# Altium footprint library 开关_按键封装库.PcbLib: 175 footprints (part 4 of 11)
Each footprint in its own frame and in the unit in brackets; x right, y up, seen from the top. Pads: shape width x height; smd on the part's side, far side on the other; paste and mask are expansions set on the pad; w line width, h text height; cw(c..) or ccw(c..) is an arc to the next point about the centre after c.
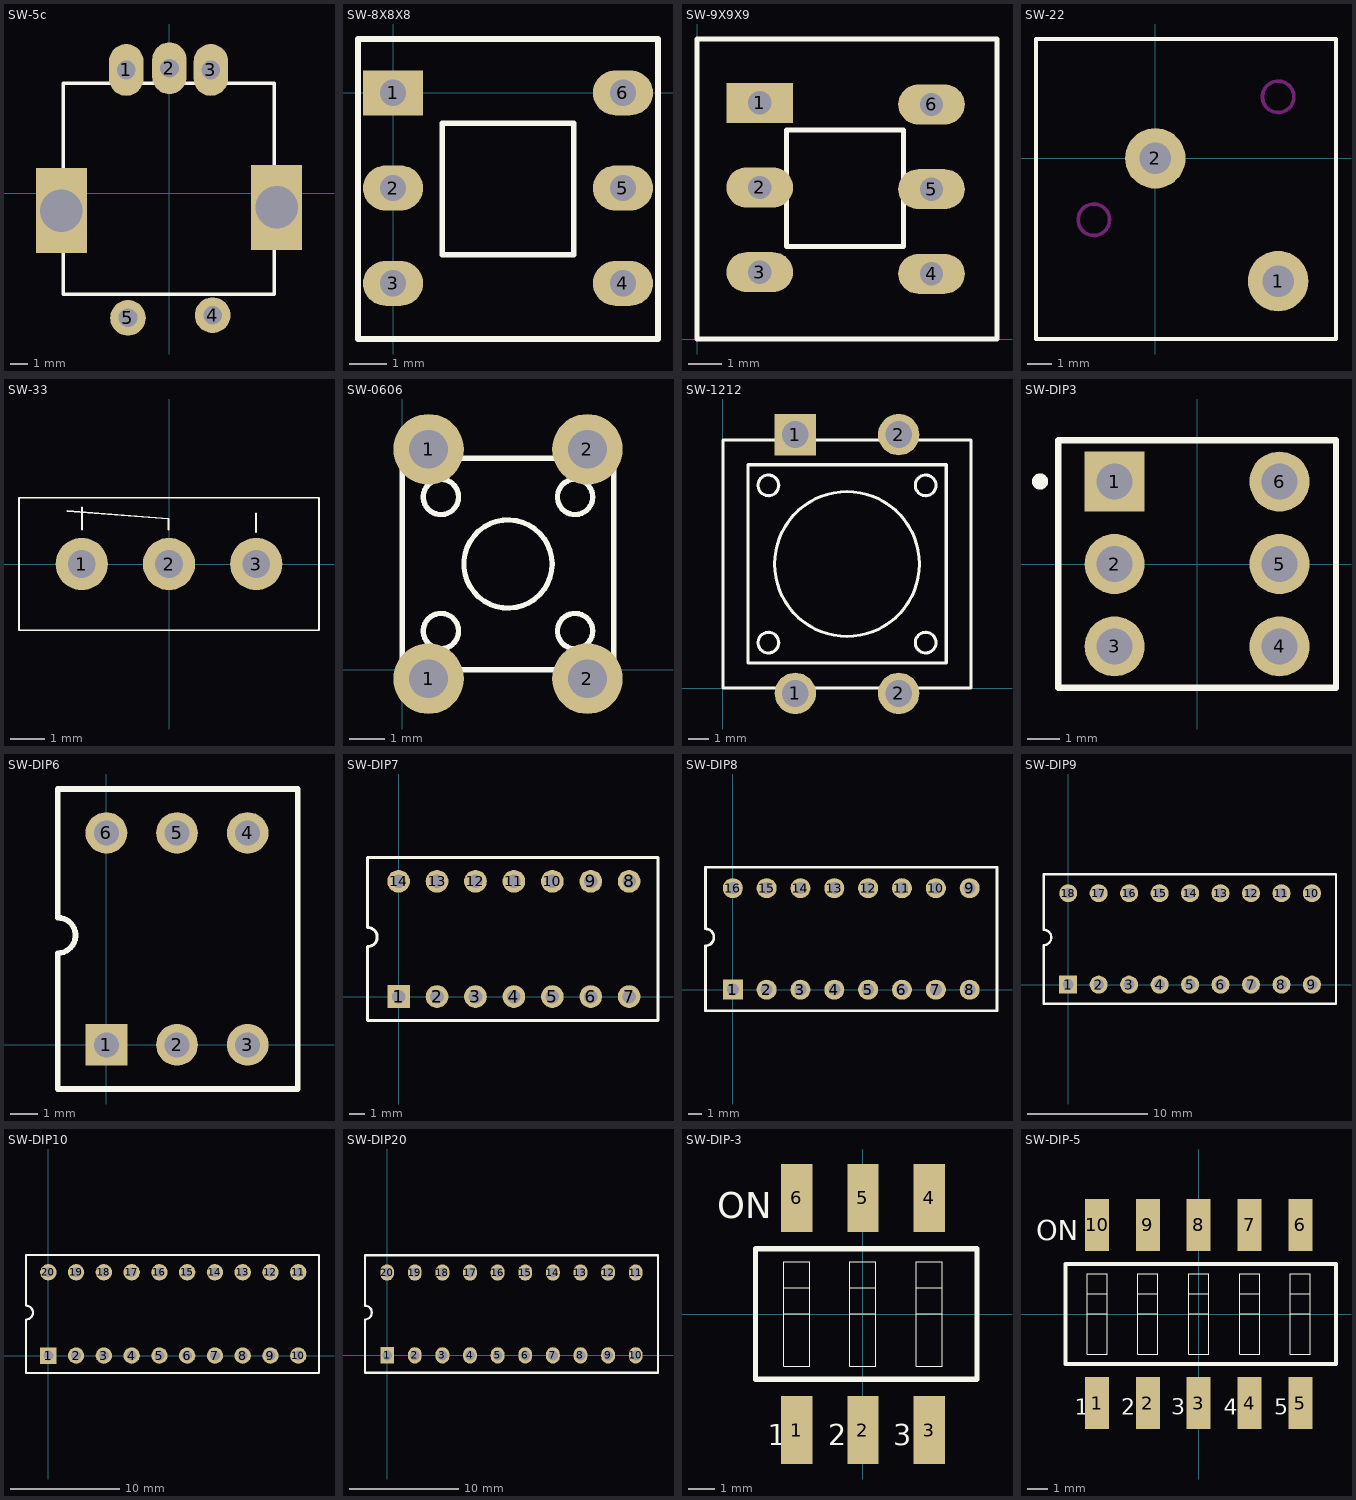
[diagram p3: the footprints below, top view; thin cyan lines are the x and y axes]

## SW-5c [mil]
pads (7):
  oval 80x120 hole 43.31: 1(-100,286) 2(0,290) 3(96,286)
  round 82.68 hole 43.31: 4(100,-282) 5(-96,-288)
  rect 118.11x196.85 hole 98.42: ""(-250,-40) ""(248,-32)
Top Overlay:
  lines w8: -245.43,-233.34 242.75,-233.34 242.75,254.85 -245.43,254.85 -245.43,-233.34
3D body "SW3dPS-Encoder Alpha RE111F-41B3N-15F-20P.STEP": height 840.55, standoff -123.26, extent -267.56,-293.93 270,289.93

## SW-8X8X8 [mm]
pads (6):
  rect 1.6x1.2 hole 0.7: 1(0,0)
  oval 1.6x1.2 hole 0.7: 2(0,-2.54) 3(0,-5.08) 4(6.131,-5.08) 5(6.131,-2.54) 6(6.131,0)
Top Overlay:
  lines w0.15: -0.935,-6.565 -0.935,1.435 7.065,1.435 7.065,-6.565 -0.935,-6.565 ; 1.313,-4.318 4.818,-4.318 4.818,-0.813 1.313,-0.813 1.313,-4.318
3D body "User Library-PSM1-0-0.step": height 13.5, standoff -3.5, extent -0.935,-6.565 7.065,1.435

## SW-9X9X9 [mm]
pads (6):
  rect 2x1.2 hole 0.7: 1(1.88,7.087)
  oval 2x1.2 hole 0.7: 2(1.88,4.547) 3(1.88,2.007) 4(7.036,1.956) 5(7.036,4.496) 6(7.036,7.036)
Top Overlay:
  lines w0.15: 0,0 0,9 9,9 9,0 0,0 ; 2.692,2.769 2.692,6.274 6.198,6.274 6.198,2.769 2.692,2.769
3D body "User Library-TL 2201.step": height 14, standoff -3.5, extent 0.25,0.25 8.75,8.75

## SW-22 [mm]
pads (2):
  round 2.5 hole 1.3: 1(5.08,-5.08) 2(0,0)
Top Overlay:
  lines w0.15: -4.93,-7.47 7.47,-7.47 7.47,4.93 -4.93,4.93 -4.93,-7.47
Keep-Out Layer:
  circle w0.15: c5.08,2.54 r0.65
  circle w0.15: c-2.54,-2.54 r0.65

## SW-33 [mm]
pads (3):
  round 1.5 hole 0.8: 1(-2.5,0) 2(0,0) 3(2.5,0)
Top Overlay:
  lines w0.051: -2.918,1.521 -0.012,1.298 -0.012,0.987 ; -2.493,0.98 -2.493,1.153 -2.493,1.622 ; 2.497,0.915 2.497,1.449 ; -4.3,-1.9 -4.3,1.9 4.3,1.9 4.3,-1.9 -4.3,-1.9

## SW-0606 [mm]
pads (4):
  round 2 hole 1.1: 1(0.75,-0.25) 1(0.75,6.25) 2(5.25,-0.25) 2(5.25,6.25)
Top Overlay:
  circle w0.15: c3,3 r1.25
  circle w0.15: c4.9,4.9 r0.5
  circle w0.15: c1.1,4.9 r0.5
  circle w0.15: c4.9,1.1 r0.5
  circle w0.15: c1.1,1.1 r0.5
  lines w0.15: 0,0 6,0 6,6 0,6 0,0
3D body "User Library-TS-1150-WP.STEP": height 5, standoff -3.5, extent -0.25,-1.134 6.25,7.134

## SW-1212 [mm]
pads (4):
  rect 2x2 hole 1.3: 1(3.5,12.25)
  round 2 hole 1.3: 1(3.5,-0.25) 2(8.5,-0.25) 2(8.5,12.25)
Top Overlay:
  circle w0.15: c9.8,9.8 r0.5
  circle w0.15: c2.2,9.8 r0.5
  circle w0.15: c9.8,2.2 r0.5
  circle w0.15: c6,6 r3.5
  circle w0.15: c2.2,2.2 r0.5
  lines w0.15: 0,0 0,12 12,12 12,0 0,0 ; 1.219,1.219 10.795,1.219 10.795,10.795 1.219,10.795 1.219,1.219
3D body "User Library-SWT9.step": height 9.5, standoff -3.5, extent 0,-0.937 12,12.937

## SW-DIP3 [mm] "Switch; 6 Leads"
pads (6):
  rect 1.85x1.85 hole 1.1: 1(-2.54,2.54)
  round 1.85 hole 1.1: 2(-2.54,0) 3(-2.54,-2.54) 4(2.54,-2.54) 5(2.54,0) 6(2.54,2.54)
Top Overlay:
  circle w0.25: c-4.836,2.541 r0.125
  lines w0.2: -4.28,-3.81 -4.28,3.81 4.28,3.81 4.28,-3.81 -4.28,-3.81
3D body "SW3dPS-DIP-Schalter SMD 3polig RM2,54.STEP": height 3.55, standoff -0.65, extent -3.81,-3.683 3.81,3.937

## SW-DIP6 [mm] "DIP; 16 Leads; Row Spacing 7.62 mm; Pitch 2.54 mm"
pads (6):
  rect 1.5x1.5 hole 0.9: 1(0,0)
  round 1.5 hole 0.9: 2(2.54,0) 3(5.08,0) 4(5.08,7.62) 5(2.54,7.62) 6(0,7.62)
Top Overlay:
  lines w0.2: -1.745,4.57 cw(c-1.745,3.935) -1.745,3.3 -1.745,-1.59 6.883,-1.59 6.883,9.2 -1.745,9.2 -1.745,4.6
3D body "SWITCH DIP-3.STEP": height 7, standoff -3.7, extent -1.753,-1.165 6.867,8.735

## SW-DIP7 [mm] "DIP; 16 Leads; Row Spacing 7.62 mm; Pitch 2.54 mm"
pads (14):
  rect 1.5x1.5 hole 0.9: 1(0,0)
  round 1.5 hole 0.9: 2(2.54,0) 3(5.08,0) 4(7.62,0) 5(10.16,0) 6(12.7,0) 7(15.24,0) 8(15.24,7.62) 9(12.7,7.62) 10(10.16,7.62) 11(7.62,7.62) 12(5.08,7.62) 13(2.54,7.62) 14(0,7.62)
Top Overlay:
  lines w0.2: -2.05,4.57 cw(c-2.05,3.935) -2.05,3.3 -2.05,-1.59 17.145,-1.59 17.145,9.2 -2.05,9.2 -2.05,4.6
3D body "DIPSWITCH7.STEP": height 6.9, standoff -3.2, extent -2.05,-1.245 17.09,8.915

## SW-DIP8 [mm] "DIP; 16 Leads; Row Spacing 7.62 mm; Pitch 2.54 mm"
pads (16):
  rect 1.5x1.5 hole 0.9: 1(0,0)
  round 1.5 hole 0.9: 2(2.54,0) 3(5.08,0) 4(7.62,0) 5(10.16,0) 6(12.7,0) 7(15.24,0) 8(17.78,0) 9(17.78,7.62) 10(15.24,7.62) 11(12.7,7.62) 12(10.16,7.62) 13(7.62,7.62) 14(5.08,7.62) 15(2.54,7.62) 16(0,7.62)
Top Overlay:
  lines w0.2: -2.05,4.57 cw(c-2.05,3.935) -2.05,3.3 -2.05,-1.59 19.83,-1.59 19.83,9.2 -2.05,9.2 -2.05,4.6
3D body "SW3dPS-DIP SWITCH 8 POS CTS 206.STEP": height 8.25, standoff -3.5, extent -2.286,-1.08 20.214,8.7

## SW-DIP9 [mm] "DIP; 16 Leads; Row Spacing 7.62 mm; Pitch 2.54 mm"
pads (18):
  rect 1.5x1.5 hole 0.9: 1(0,0)
  round 1.5 hole 0.9: 2(2.54,0) 3(5.08,0) 4(7.62,0) 5(10.16,0) 6(12.7,0) 7(15.24,0) 8(17.78,0) 9(20.32,0) 10(20.32,7.62) 11(17.78,7.62) 12(15.24,7.62) 13(12.7,7.62) 14(10.16,7.62) 15(7.62,7.62) 16(5.08,7.62) 17(2.54,7.62) 18(0,7.62)
Top Overlay:
  lines w0.2: -2.05,4.57 cw(c-2.05,3.935) -2.05,3.3 -2.05,-1.59 22.327,-1.59 22.327,9.2 -2.05,9.2 -2.05,4.6
3D body "DIPSWITCH9.STEP": height 6.9, standoff -3.2, extent -2.046,-1.245 22.174,8.915

## SW-DIP10 [mm] "DIP; 16 Leads; Row Spacing 7.62 mm; Pitch 2.54 mm"
pads (20):
  rect 1.5x1.5 hole 0.9: 1(0,0)
  round 1.5 hole 0.9: 2(2.54,0) 3(5.08,0) 4(7.62,0) 5(10.16,0) 6(12.7,0) 7(15.24,0) 8(17.78,0) 9(20.32,0) 10(22.86,0) 11(22.86,7.62) 12(20.32,7.62) 13(17.78,7.62) 14(15.24,7.62) 15(12.7,7.62) 16(10.16,7.62) 17(7.62,7.62) 18(5.08,7.62) 19(2.54,7.62) 20(0,7.62)
Top Overlay:
  lines w0.2: -2.05,4.57 cw(c-2.05,3.935) -2.05,3.3 -2.05,-1.59 24.765,-1.59 24.765,9.2 -2.05,9.2 -2.05,4.6
3D body "DIPSWITCH10.STEP": height 6.9, standoff -3.2, extent -2.007,-1.295 24.753,8.865

## SW-DIP20 [mm] "DIP; 16 Leads; Row Spacing 7.62 mm; Pitch 2.54 mm"
pads (20):
  rect 1.27x1.5 hole 0.9: 1(0,0)
  oval 1.27x1.5 hole 0.9: 2(2.54,0) 3(5.08,0) 4(7.62,0) 5(10.16,0) 6(12.7,0) 7(15.24,0) 8(17.78,0) 9(20.32,0) 10(22.86,0) 11(22.86,7.62) 12(20.32,7.62) 13(17.78,7.62) 14(15.24,7.62) 15(12.7,7.62) 16(10.16,7.62) 17(7.62,7.62) 18(5.08,7.62) 19(2.54,7.62) 20(0,7.62)
Top Overlay:
  lines w0.2: -2.05,-1.59 -2.05,3.3 ccw(c-2.05,3.935) -2.05,4.57 ; -2.05,4.6 -2.05,9.2 ; 24.91,-1.59 24.91,9.2
  lines w0.203: -2.05,-1.59 24.892,-1.59 ; -2.05,9.2 24.892,9.2
3D body "User Library-DIP Switch Piano 10X.STEP": height 8.71, standoff -3.99, extent -2.086,-2.639 24.794,8.661

## SW-DIP-3 [mm] "DIP Switch; 16 Leads"
height 5.06
pads (6):
  rect 1.2x2.6 smd: 1(-2.54,-4.45) 2(0,-4.45) 3(2.54,-4.45) 4(2.54,4.45) 5(0,4.45) 6(-2.54,4.45)
Top Overlay:
  lines w0.025: -3.04,0 -2.04,0 ; -3.04,1 -2.04,1 ; -0.5,0 0.5,0 ; -0.5,1 0.5,1 ; 2.04,0 3.04,0 ; 2.04,1 3.04,1 ; -3.04,-2 -2.04,-2 -2.04,2 -3.04,2 -3.04,-2 ; -0.5,-2 0.5,-2 0.5,2 -0.5,2 -0.5,-2 ; 2.04,-2 3.04,-2 3.04,2 2.04,2 2.04,-2
  lines w0.2: -4.115,-2.5 4.369,-2.5 4.369,2.5 -4.115,2.5 -4.115,-2.5
  text "ON" at -5.588,3.678 h1
  text "1" at -3.656,-5.032 h0.8
  text "2" at -1.331,-5.032 h0.8
  text "3" at 1.169,-5.032 h0.8
3D body "DIP3.stp": height 4.4, standoff 0, extent -4.293,-4.951 4.267,4.849

## SW-DIP-5 [mm] "DIP Switch; 16 Leads"
height 5.06
pads (10):
  rect 1.2x2.6 smd: 1(-5.08,-4.45) 2(-2.54,-4.45) 3(0,-4.45) 4(2.54,-4.45) 5(5.08,-4.45) 6(5.08,4.45) 7(2.54,4.45) 8(0,4.45) 9(-2.54,4.45) 10(-5.08,4.45)
Top Overlay:
  lines w0.025: -5.58,0 -4.58,0 ; -5.58,1 -4.58,1 ; -3.04,0 -2.04,0 ; -3.04,1 -2.04,1 ; -0.5,0 0.5,0 ; -0.5,1 0.5,1 ; 2.04,0 3.04,0 ; 2.04,1 3.04,1 ; 4.58,0 5.58,0 ; 4.58,1 5.58,1 ; -5.58,-2 -5.58,2 -4.58,2 -4.58,-2 -5.58,-2 ; -3.04,-2 -3.04,2 -2.04,2 -2.04,-2 -3.04,-2 ; -0.5,-2 -0.5,2 0.5,2 0.5,-2 -0.5,-2 ; 2.04,-2 2.04,2 3.04,2 3.04,-2 2.04,-2 ; 4.58,-2 4.58,2 5.58,2 5.58,-2 4.58,-2
  lines w0.2: -6.655,-2.5 -6.655,2.5 6.858,2.5 6.858,-2.5 -6.655,-2.5
  text "5" at 3.779,-5.032 h0.8
  text "4" at 1.254,-5.032 h0.8
  text "3" at -1.371,-5.032 h0.8
  text "2" at -3.871,-5.032 h0.8
  text "1" at -6.196,-5.032 h0.8
  text "ON" at -8.128,3.678 h1
3D body "DIP5.stp": height 4.4, standoff 0, extent -6.795,-5.105 6.845,4.695